# Altium footprint library 6-Connectors-1.PcbLib: 54 footprints (part 4 of 5) (continued)
## SCHURTER_GSF1.1201.31 [mm] "IEC Appliance Inlet C14 with Fuseholder 1 Pole" (continued)
  text "N" at 10.7,-10.65 h1.5
  text "L" at -16.822,-8.9 h1.5
3D body "SCHURTER_GSF1.1201.31.stp": height 24.45, standoff -4.55, extent -17.2,-18.9 17.2,12
3D body "v240-170.stp": height 0.02, standoff -1.65, extent 7.85,-11.1 10.25,-8.7
3D body "v240-170.stp": height 0.02, standoff -1.65, extent -1.2,-11.1 1.2,-8.7

## SCHURTER_GSF1.2202.31 [mm] "IEC Appliance Inlet C14 with 2 Pole Fuseholder"
height 24.45
pads (5):
  round 2.1 hole 1.4: 1(-12.7,-5.5) 3(12.7,-5.5)
  round 2.3 hole 1.6: 2(0,-9.9)
  round 1 hole 6 unplated mask+2.5: 4(-13.5,0) 5(13.5,0)
Top Overlay:
  drawing of 178 lines, arcs and shapes, not listed
  text "N" at 15.9,-8.95 h1.5
  text "L" at -16.797,-8.925 h1.5
Mechanical 8:
  circle w0.1: c12.7,-9.545 r2.5
  circle w0.1: c-12.7,-9.545 r2.5
  lines w0.1: -14.5,0 -13.5,0 ; -13.7,-5.5 -12.7,-5.5 ; -13.5,-1 -13.5,0 ; -13.5,1 -13.5,0 ; -13.407,-10.252 -12.7,-9.545 ; -13.407,-8.838 -12.7,-9.545 ; -12.7,-6.5 -12.7,-5.5 ; -12.7,-4.5 -12.7,-5.5 ; -12.5,0 -13.5,0 ; -11.993,-10.252 -12.7,-9.545 ; -11.993,-8.838 -12.7,-9.545 ; -11.7,-5.5 -12.7,-5.5 ; -8.875,-4.425 -12.7,-8.25 -12.7,-9.545 ; -1,-9.9 0,-9.9 ; -1,0 0,0 ; 0,-10.9 0,-9.9 ; 0,-8.9 0,-9.9 ; 0,-1 0,0 ; 0,1 0,0 ; 1,-9.9 0,-9.9 ; 1,0 0,0 ; 8.875,-4.425 12.7,-8.25 12.7,-9.545 ; 11.7,-5.5 12.7,-5.5 ; 11.993,-10.252 12.7,-9.545 ; 11.993,-8.838 12.7,-9.545 ; 12.5,0 13.5,0 ; 12.7,-6.5 12.7,-5.5 ; 12.7,-4.5 12.7,-5.5 ; 13.407,-10.252 12.7,-9.545 ; 13.407,-8.838 12.7,-9.545 ; 13.5,-1 13.5,0 ; 13.5,1 13.5,0 ; 13.7,-5.5 12.7,-5.5 ; 14.5,0 13.5,0
  text "3D Fuse (5X20) Stand-off Heigh" at -11.525,-3.975 h1
  text "Must be 2mm" at -5.075,-5.95 h1
Mechanical 14:
  drawing of 175 lines, arcs and shapes, not listed
  text "N" at 15.9,-8.95 h1.5
  text "L" at -16.797,-8.925 h1.5
3D body "SCHURTER_GSF1.2202.31.stp": height 24.45, standoff -4.55, extent -17.2,-13.3 17.2,12
3D body "v240-170.stp": height 0.02, standoff -1.65, extent -13.9,-6.7 -11.5,-4.3
3D body "v240-170.stp": height 0.02, standoff -1.65, extent -1.2,-11.1 1.2,-8.7
3D body "v240-170.stp": height 0.02, standoff -1.65, extent 11.5,-6.7 13.9,-4.3

## TP [mm]
height 11.7
pads (1):
  round 2 smd mask+1: W(0,0)
Top Overlay:
  circle w0.254: c0,0 r2.195
Keep-Out Layer:
  circle w0.025: c0,0 r2.017
3D body "1_016-1_016-3_tp.stp": height 0.02, standoff 0, extent -1.5,-1.5 1.5,1.5

## TYCO_1-338309-2 [mm] "Straight D-SUB 9 Male Contacts Connector with Harpoons and Female Screwlock (UNC4-40)"
height 11.7
pads (11):
  round 1.5 hole 0.8: 1(-5.486,1.423) 2(-2.743,1.423) 3(0,1.423) 4(2.743,1.423) 5(5.486,1.423) 6(-4.114,-1.423) 7(-1.371,-1.423) 8(1.372,-1.423) 9(4.115,-1.423)
  round 3.8 hole 3.2: 10(-12.495,0) 11(12.495,0)
Top Overlay:
  circle w0.5: c-5.48,7.42 r0.25
  lines w0.2: -15.445,-4.7 ccw(c-13.945,-4.7) -13.945,-6.2 13.945,-6.2 ccw(c13.945,-4.7) 15.445,-4.7 15.445,4.7 ccw(c13.945,4.7) 13.945,6.2 -13.945,6.2 ccw(c-13.945,4.7) -15.445,4.7 -15.445,-4.7 ; -8.775,1.021 cw(c-5.83,1.54) -5.83,4.53 5.83,4.53 cw(c5.83,1.54) 8.775,1.021 8.232,-2.059 cw(c5.287,-1.54) 5.287,-4.53 -5.287,-4.53 cw(c-5.287,-1.54) -8.231,-2.059 -8.775,1.021 ; -8.381,1.09 cw(c-5.83,1.54) -5.83,4.13 5.83,4.13 cw(c5.83,1.54) 8.381,1.09 7.838,-1.99 cw(c5.287,-1.54) 5.287,-4.13 -5.287,-4.13 cw(c-5.287,-1.54) -7.838,-1.99 -8.381,1.09
  text "6" at -6.21,-1.97 h1.2
  text "5" at 6.855,0.87 h1.2
  text "1" at -7.18,0.945 h1.2
  text "9" at 5.485,-2.02 h1.2
Mechanical 8:
  lines w0.1: -12.995,0 -12.495,0 ; -12.495,-0.5 -12.495,0 ; -12.495,0.5 -12.495,0 ; -11.995,0 -12.495,0 ; -5.986,1.423 -5.486,1.423 ; -5.486,0.923 -5.486,1.423 ; -5.486,1.923 -5.486,1.423 ; -4.986,1.423 -5.486,1.423 ; -4.614,-1.423 -4.114,-1.423 ; -4.114,-1.923 -4.114,-1.423 ; -4.114,-0.923 -4.114,-1.423 ; -3.614,-1.423 -4.114,-1.423 ; -3.243,1.423 -2.743,1.423 ; -2.743,0.923 -2.743,1.423 ; -2.743,1.923 -2.743,1.423 ; -2.243,1.423 -2.743,1.423 ; -1.871,-1.423 -1.371,-1.423 ; -1.371,-1.923 -1.371,-1.423 ; -1.371,-0.923 -1.371,-1.423 ; -0.871,-1.423 -1.371,-1.423 ; -0.5,0 0,0 ; -0.5,1.423 0,1.423 ; 0,-0.5 0,0 ; 0,0.5 0,0 ; 0,0.923 0,1.423 ; 0,1.923 0,1.423 ; 0.5,0 0,0 ; 0.5,1.423 0,1.423 ; 0.872,-1.423 1.372,-1.423 ; 1.372,-1.923 1.372,-1.423 ; 1.372,-0.923 1.372,-1.423 ; 1.872,-1.423 1.372,-1.423 ; 2.243,1.423 2.743,1.423 ; 2.743,0.923 2.743,1.423 ; 2.743,1.923 2.743,1.423 ; 3.243,1.423 2.743,1.423 ; 3.615,-1.423 4.115,-1.423 ; 4.115,-1.923 4.115,-1.423 ; 4.115,-0.923 4.115,-1.423 ; 4.615,-1.423 4.115,-1.423 ; 4.986,1.423 5.486,1.423 ; 5.486,0.923 5.486,1.423 ; 5.486,1.923 5.486,1.423 ; 5.986,1.423 5.486,1.423 ; 11.995,0 12.495,0 ; 12.495,-0.5 12.495,0 ; 12.495,0.5 12.495,0 ; 12.995,0 12.495,0
Mechanical 14:
  circle w0.1: c-4.114,-1.423 r0.51
  circle w0.1: c-1.371,-1.423 r0.51
  circle w0.1: c1.372,-1.423 r0.51
  circle w0.1: c4.115,-1.423 r0.51
  circle w0.1: c5.486,1.423 r0.51
  circle w0.1: c2.743,1.423 r0.51
  circle w0.1: c0,1.423 r0.51
  circle w0.1: c-2.743,1.423 r0.51
  circle w0.1: c-5.486,1.423 r0.51
  circle w0.1: c12.495,0 r1.422
  circle w0.1: c-12.495,0 r1.422
  lines w0.1: -15.445,-4.7 ccw(c-13.945,-4.7) -13.945,-6.2 13.945,-6.2 ccw(c13.945,-4.7) 15.445,-4.7 15.445,4.7 ccw(c13.945,4.7) 13.945,6.2 -13.945,6.2 ccw(c-13.945,4.7) -15.445,4.7 -15.445,-4.7 ; -8.775,1.021 cw(c-5.83,1.54) -5.83,4.53 5.83,4.53 cw(c5.83,1.54) 8.775,1.021 8.232,-2.059 cw(c5.287,-1.54) 5.287,-4.53 -5.287,-4.53 cw(c-5.287,-1.54) -8.231,-2.059 -8.775,1.021 ; -8.381,1.09 cw(c-5.83,1.54) -5.83,4.13 5.83,4.13 cw(c5.83,1.54) 8.381,1.09 7.838,-1.99 cw(c5.287,-1.54) 5.287,-4.13 -5.287,-4.13 cw(c-5.287,-1.54) -7.838,-1.99 -8.381,1.09
  text "9" at 5.485,-2.02 h1.2
  text "1" at -7.18,0.945 h1.2
  text "5" at 6.855,0.87 h1.2
  text "6" at -6.21,-1.97 h1.2
  text "9 D-Sub Male" at -6.053,4.872 h1.2
3D body "TYCO_1-338309-2.stp": height 11.95, standoff -3.2, extent -15.445,-6.2 15.445,6.2

## TYCO_1-1393480-7 [mm] "Right Angle D-SUB 9 Female Contacts for PCB, with Grounding Straps, Without Grounding Indents, and Without Mating Connector Lock"
height 10.06
pads (11):
  round 1.5 hole 0.9: 1(-5.48,-1.27) 2(-2.74,-1.27) 3(0,-1.27) 4(2.74,-1.27) 5(5.48,-1.27) 6(-4.11,1.27) 7(-1.37,1.27) 8(1.37,1.27) 9(4.11,1.27)
  round 5.5 hole 3.2: 10(-12.5,0) 11(12.5,0)
Top Overlay:
  lines w0.2: -15.595,-0.586 -15.595,-2.92 ccw(c-13.995,-2.92) -13.995,-4.52 -11.195,-4.52 ccw(c-11.195,-2.92) -9.595,-2.92 -9.595,-1.218 ; -15.595,0.586 -15.595,10.48 15.595,10.48 15.595,0.586 ; -15.595,8.03 -11.595,8.03 -11.595,8.53 ; -15.595,8.53 -9.75,8.53 ; -15.595,10.03 15.595,10.03 ; -14.095,8.53 -14.095,10.48 ; -10.195,8.53 -10.195,10.03 ; -9.75,9.33 9.75,9.33 ; -9.75,10.03 -9.75,4.33 9.75,4.33 9.75,10.03 ; -9.595,1.218 -9.595,4.33 ; -8.19,10.48 -8.19,16.48 cw(c-7.89,16.48) -7.89,16.78 7.89,16.78 cw(c7.89,16.48) 8.19,16.48 8.19,10.48 ; 9.595,-1.218 9.595,-2.92 ccw(c11.195,-2.92) 11.195,-4.52 13.995,-4.52 ccw(c13.995,-2.92) 15.595,-2.92 15.595,-0.586 ; 9.595,1.218 9.595,4.33 ; 9.75,8.53 15.595,8.53 ; 10.195,8.53 10.195,10.03 ; 11.595,8.53 11.595,8.03 15.595,8.03 ; 14.095,8.53 14.095,10.48
  text "9" at 6.731,0.508 h1.5
  text "1" at -7.239,-2.032 h1.5
  text "5" at 6.731,-2.032 h1.5
  text "6" at -7.366,0.508 h1.5
Mechanical 8:
  lines w0.1: -15.595,8.53 0,8.53 15.595,8.53 ; -13,0 -12.5,0 ; -12.5,-0.5 -12.5,0 ; -12.5,0.5 -12.5,0 ; -12,0 -12.5,0 ; -5.98,-1.27 -5.48,-1.27 ; -5.48,-1.77 -5.48,-1.27 ; -5.48,-0.77 -5.48,-1.27 ; -4.98,-1.27 -5.48,-1.27 ; -4.61,1.27 -4.11,1.27 ; -4.11,0.77 -4.11,1.27 ; -4.11,1.77 -4.11,1.27 ; -3.61,1.27 -4.11,1.27 ; -3.24,-1.27 -2.74,-1.27 ; -2.74,-1.77 -2.74,-1.27 ; -2.74,-0.77 -2.74,-1.27 ; -2.24,-1.27 -2.74,-1.27 ; -1.87,1.27 -1.37,1.27 ; -1.37,0.77 -1.37,1.27 ; -1.37,1.77 -1.37,1.27 ; -0.87,1.27 -1.37,1.27 ; -0.5,-1.27 0,-1.27 ; -0.5,0 0,0 ; 0,-1.77 0,-1.27 ; 0,-0.77 0,-1.27 ; 0,-0.5 0,0 ; 0,0.5 0,0 ; 0.5,-1.27 0,-1.27 ; 0.5,0 0,0 ; 0.87,1.27 1.37,1.27 ; 1.37,0.77 1.37,1.27 ; 1.37,1.77 1.37,1.27 ; 1.87,1.27 1.37,1.27 ; 2.24,-1.27 2.74,-1.27 ; 2.74,-1.77 2.74,-1.27 ; 2.74,-0.77 2.74,-1.27 ; 3.24,-1.27 2.74,-1.27 ; 3.61,1.27 4.11,1.27 ; 4.11,0.77 4.11,1.27 ; 4.11,1.77 4.11,1.27 ; 4.61,1.27 4.11,1.27 ; 4.98,-1.27 5.48,-1.27 ; 5.48,-1.77 5.48,-1.27 ; 5.48,-0.77 5.48,-1.27 ; 5.98,-1.27 5.48,-1.27 ; 12,0 12.5,0 ; 12.5,-0.5 12.5,0 ; 12.5,0.5 12.5,0 ; 13,0 12.5,0
Mechanical 14:
  circle w0.1: c-12.5,0 r1.55
  circle w0.1: c12.5,0 r1.55
  lines w0.1: -15.595,8.03 -11.595,8.03 -11.595,8.53 ; -15.595,8.53 -9.75,8.53 ; -15.595,10.03 15.595,10.03 ; -14.095,8.53 -14.095,10.48 ; -10.195,8.53 -10.195,10.03 ; -9.75,9.33 9.75,9.33 ; -9.75,10.03 -9.75,4.33 9.75,4.33 9.75,10.03 ; -9.595,4.33 -9.595,-2.92 cw(c-11.195,-2.92) -11.195,-4.52 -13.995,-4.52 cw(c-13.995,-2.92) -15.595,-2.92 -15.595,10.48 15.595,10.48 15.595,-2.92 cw(c13.995,-2.92) 13.995,-4.52 11.195,-4.52 cw(c11.195,-2.92) 9.595,-2.92 9.595,4.33 ; -8.19,10.48 -8.19,16.48 cw(c-7.89,16.48) -7.89,16.78 7.89,16.78 cw(c7.89,16.48) 8.19,16.48 8.19,10.48 ; -5.78,4.33 -5.78,-1.42 -5.18,-1.42 -5.18,4.33 ; -4.41,4.33 -4.41,1.12 -3.81,1.12 -3.81,4.33 ; -3.04,4.33 -3.04,-1.42 -2.44,-1.42 -2.44,4.33 ; -1.67,4.33 -1.67,1.12 -1.07,1.12 -1.07,4.33 ; -0.3,4.33 -0.3,-1.42 0.3,-1.42 0.3,4.33 ; 1.07,4.33 1.07,1.12 1.67,1.12 1.67,4.33 ; 2.44,4.33 2.44,-1.42 3.04,-1.42 3.04,4.33 ; 3.81,4.33 3.81,1.12 4.41,1.12 4.41,4.33 ; 5.18,4.33 5.18,-1.42 5.78,-1.42 5.78,4.33 ; 9.75,8.53 15.595,8.53 ; 10.195,8.53 10.195,10.03 ; 11.595,8.53 11.595,8.03 15.595,8.03 ; 14.095,8.53 14.095,10.48
3D body "TYCO_1-1393480-7.stp": height 10.06, standoff -3.2, extent -15.595,-4.52 15.595,16.78
3D body "v160-080.stp": height 0.02, standoff -1.65, extent -4.91,0.47 -3.31,2.07
3D body "v160-080.stp": height 0.02, standoff -1.65, extent -6.28,-2.07 -4.68,-0.47
3D body "v160-080.stp": height 0.02, standoff -1.65, extent -3.54,-2.07 -1.94,-0.47
3D body "v160-080.stp": height 0.02, standoff -1.65, extent -2.17,0.47 -0.57,2.07
3D body "v160-080.stp": height 0.02, standoff -1.65, extent -0.8,-2.07 0.8,-0.47
3D body "v160-080.stp": height 0.02, standoff -1.65, extent 1.94,-2.07 3.54,-0.47
3D body "v160-080.stp": height 0.02, standoff -1.65, extent 0.57,0.47 2.17,2.07
3D body "v160-080.stp": height 0.02, standoff -1.65, extent 3.31,0.47 4.91,2.07
3D body "v160-080.stp": height 0.02, standoff -1.65, extent 4.68,-2.07 6.28,-0.47

## TYCO_3-1634221-2 [mm] "Straight D-SUB 37 Male Contacts for PCB  with Harpoons and Female Screwlock (UNC4-40)"
height 12.6
pads (39):
  round 1.6 hole 1: 1(-24.93,1.42) 2(-22.16,1.42) 3(-19.39,1.42) 4(-16.62,1.42) 5(-13.85,1.42) 6(-11.08,1.42) 7(-8.31,1.42) 8(-5.54,1.42) 9(-2.77,1.42) 10(0,1.42) 11(2.77,1.42) 12(5.54,1.42) 13(8.31,1.42) 14(11.08,1.42) 15(13.85,1.42) 16(16.62,1.42) 17(19.39,1.42) 18(22.16,1.42) 19(24.93,1.42) 20(-23.545,-1.42) 21(-20.775,-1.42) 22(-18.005,-1.42) 23(-15.235,-1.42) 24(-12.465,-1.42) 25(-9.695,-1.42) 26(-6.925,-1.42) 27(-4.155,-1.42) 28(-1.385,-1.42) 29(1.385,-1.42) 30(4.155,-1.42) 31(6.925,-1.42) 32(9.695,-1.42) 33(12.465,-1.42) 34(15.235,-1.42) 35(18.005,-1.42) 36(20.775,-1.42) 37(23.545,-1.42)
  round 5.5 hole 3.1: 38(31.755,0) 39(-31.755,0)
Top Overlay:
  circle w0.5: c24.93,7.42 r0.25
  lines w0.2: -34.7,-4.675 ccw(c-33.1,-4.675) -33.1,-6.275 33.1,-6.275 ccw(c33.1,-4.675) 34.7,-4.675 34.7,4.675 ccw(c33.1,4.675) 33.1,6.275 -33.1,6.275 ccw(c-33.1,4.675) -34.7,4.675 -34.7,-4.675 ; -27.776,0.946 cw(c-24.92,1.45) -24.92,4.35 24.92,4.35 cw(c24.92,1.45) 27.776,0.946 27.265,-1.954 cw(c24.409,-1.45) 24.409,-4.35 -24.409,-4.35 cw(c-24.409,-1.45) -27.265,-1.954 -27.776,0.946 ; -27.382,1.016 cw(c-24.92,1.45) -24.92,3.95 24.92,3.95 cw(c24.92,1.45) 27.382,1.016 26.871,-1.884 cw(c24.409,-1.45) 24.409,-3.95 -24.409,-3.95 cw(c-24.409,-1.45) -26.871,-1.884 -27.382,1.016
  text "37" at 26.059,-5.715 h1.2
  text "20" at -28.27,-5.842 h1.2
  text "1" at -27,4.318 h1.2
  text "19" at 26.543,4.318 h1.2
Mechanical 8:
  drawing of 160 lines, arcs and shapes, not listed
Mechanical 14:
  circle w0.1: c-22.16,1.42 r0.5
  circle w0.1: c-19.39,1.42 r0.5
  circle w0.1: c-16.62,1.42 r0.5
  circle w0.1: c-15.235,-1.42 r0.5
  circle w0.1: c-11.08,1.42 r0.5
  circle w0.1: c-9.695,-1.42 r0.5
  circle w0.1: c-5.54,1.42 r0.5
  circle w0.1: c-2.77,1.42 r0.5
  circle w0.1: c0,1.42 r0.5
  circle w0.1: c1.385,-1.42 r0.5
  circle w0.1: c5.54,1.42 r0.5
  circle w0.1: c11.08,1.42 r0.5
  circle w0.1: c16.62,1.42 r0.5
  circle w0.1: c22.16,1.42 r0.5
  circle w0.1: c6.925,-1.42 r0.5
  circle w0.1: c12.465,-1.42 r0.5
  circle w0.1: c18.005,-1.42 r0.5
  circle w0.1: c23.545,-1.42 r0.5
  circle w0.1: c20.775,-1.42 r0.5
  circle w0.1: c15.235,-1.42 r0.5
  circle w0.1: c9.695,-1.42 r0.5
  circle w0.1: c4.155,-1.42 r0.5
  circle w0.1: c19.39,1.42 r0.5
  circle w0.1: c13.85,1.42 r0.5
  circle w0.1: c8.31,1.42 r0.5
  circle w0.1: c2.77,1.42 r0.5
  circle w0.1: c-1.385,-1.42 r0.5
  circle w0.1: c-4.155,-1.42 r0.5
  circle w0.1: c-6.925,-1.42 r0.5
  circle w0.1: c-8.31,1.42 r0.5
  circle w0.1: c-12.465,-1.42 r0.5
  circle w0.1: c-13.85,1.42 r0.5
  circle w0.1: c-18.005,-1.42 r0.5
  circle w0.1: c-20.775,-1.42 r0.5
  circle w0.1: c-23.545,-1.42 r0.5
  circle w0.1: c-24.93,1.42 r0.5
  circle w0.1: c24.93,1.42 r0.5
  circle w0.1: c-31.755,0 r1.422
  circle w0.1: c31.755,0 r1.422
  lines w0.1: -34.7,-4.675 ccw(c-33.1,-4.675) -33.1,-6.275 33.1,-6.275 ccw(c33.1,-4.675) 34.7,-4.675 34.7,4.675 ccw(c33.1,4.675) 33.1,6.275 -33.1,6.275 ccw(c-33.1,4.675) -34.7,4.675 -34.7,-4.675 ; -34.497,0 -33.126,2.375 -30.384,2.375 -29.013,0 -30.384,-2.375 -33.126,-2.375 -34.497,0 ; -27.776,0.946 cw(c-24.92,1.45) -24.92,4.35 24.92,4.35 cw(c24.92,1.45) 27.776,0.946 27.265,-1.954 cw(c24.409,-1.45) 24.409,-4.35 -24.409,-4.35 cw(c-24.409,-1.45) -27.265,-1.954 -27.776,0.946 ; -27.382,1.016 cw(c-24.92,1.45) -24.92,3.95 24.92,3.95 cw(c24.92,1.45) 27.382,1.016 26.871,-1.884 cw(c24.409,-1.45) 24.409,-3.95 -24.409,-3.95 cw(c-24.409,-1.45) -26.871,-1.884 -27.382,1.016 ; 29.013,0 30.384,2.375 33.126,2.375 34.497,0 33.126,-2.375 30.384,-2.375 29.013,0
  text "37 D-Sub Male" at -8.128,4.572 h1.5
  text "37" at 26.059,-5.715 h1.5
  text "20" at -28.27,-5.842 h1.5
  text "1" at -27,4.318 h1.5
  text "19" at 26.543,4.318 h1.5
3D body "TYCO_3-1634221-2.stp": height 12.6, standoff -4.5, extent -34.7,-6.275 34.7,6.275

## TYCO_3-1634225-2 [mm] "Straight D-SUB 37 Female Contacts for PCB  with Harpoons and Female Screwlock (UNC4-40)"
height 12.15
pads (39):
  round 1.6 hole 1: 1(24.93,1.42) 2(22.16,1.42) 3(19.39,1.42) 4(16.62,1.42) 5(13.85,1.42) 6(11.08,1.42) 7(8.31,1.42) 8(5.54,1.42) 9(2.77,1.42) 10(0,1.42) 11(-2.77,1.42) 12(-5.54,1.42) 13(-8.31,1.42) 14(-11.08,1.42) 15(-13.85,1.42) 16(-16.62,1.42) 17(-19.39,1.42) 18(-22.16,1.42) 19(-24.93,1.42) 20(23.545,-1.42) 21(20.775,-1.42) 22(18.005,-1.42) 23(15.235,-1.42) 24(12.465,-1.42) 25(9.695,-1.42) 26(6.925,-1.42) 27(4.155,-1.42) 28(1.385,-1.42) 29(-1.385,-1.42) 30(-4.155,-1.42) 31(-6.925,-1.42) 32(-9.695,-1.42) 33(-12.465,-1.42) 34(-15.235,-1.42) 35(-18.005,-1.42) 36(-20.775,-1.42) 37(-23.545,-1.42)
  round 5.5 hole 3.1: 38(31.755,0) 39(-31.755,0)
Top Overlay:
  circle w0.5: c24.93,7.42 r0.25
  lines w0.2: -34.7,-4.675 ccw(c-33.1,-4.675) -33.1,-6.275 33.1,-6.275 ccw(c33.1,-4.675) 34.7,-4.675 34.7,4.675 ccw(c33.1,4.675) 33.1,6.275 -33.1,6.275 ccw(c-33.1,4.675) -34.7,4.675 -34.7,-4.675 ; -27.382,1.016 cw(c-24.92,1.45) -24.92,3.95 24.92,3.95 cw(c24.92,1.45) 27.382,1.016 26.871,-1.884 cw(c24.409,-1.45) 24.409,-3.95 -24.409,-3.95 cw(c-24.409,-1.45) -26.871,-1.884 -27.382,1.016 ; -26.988,1.085 cw(c-24.92,1.45) -24.92,3.55 24.92,3.55 cw(c24.92,1.45) 26.988,1.085 26.477,-1.815 cw(c24.409,-1.45) 24.409,-3.55 -24.409,-3.55 cw(c-24.409,-1.45) -26.477,-1.815 -26.988,1.085
  text "20" at 22.249,-5.842 h1.2
  text "37" at -24.841,-5.842 h1.2
  text "19" at -25.984,4.445 h1.2
  text "1" at 24.765,4.445 h1.2
Mechanical 8:
  drawing of 160 lines, arcs and shapes, not listed
Mechanical 14:
  circle w0.1: c-22.16,1.42 r0.5
  circle w0.1: c-19.39,1.42 r0.5
  circle w0.1: c-16.62,1.42 r0.5
  circle w0.1: c-15.235,-1.42 r0.5
  circle w0.1: c-11.08,1.42 r0.5
  circle w0.1: c-9.695,-1.42 r0.5
  circle w0.1: c-5.54,1.42 r0.5
  circle w0.1: c-2.77,1.42 r0.5
  circle w0.1: c0,1.42 r0.5
  circle w0.1: c1.385,-1.42 r0.5
  circle w0.1: c5.54,1.42 r0.5
  circle w0.1: c11.08,1.42 r0.5
  circle w0.1: c16.62,1.42 r0.5
  circle w0.1: c22.16,1.42 r0.5
  circle w0.1: c6.925,-1.42 r0.5
  circle w0.1: c12.465,-1.42 r0.5
  circle w0.1: c18.005,-1.42 r0.5
  circle w0.1: c23.545,-1.42 r0.5
  circle w0.1: c20.775,-1.42 r0.5
  circle w0.1: c15.235,-1.42 r0.5
  circle w0.1: c9.695,-1.42 r0.5
  circle w0.1: c4.155,-1.42 r0.5
  circle w0.1: c19.39,1.42 r0.5
  circle w0.1: c13.85,1.42 r0.5
  circle w0.1: c8.31,1.42 r0.5
  circle w0.1: c2.77,1.42 r0.5
  circle w0.1: c-1.385,-1.42 r0.5
  circle w0.1: c-4.155,-1.42 r0.5
  circle w0.1: c-6.925,-1.42 r0.5
  circle w0.1: c-8.31,1.42 r0.5
  circle w0.1: c-12.465,-1.42 r0.5
  circle w0.1: c-13.85,1.42 r0.5
  circle w0.1: c-18.005,-1.42 r0.5
  circle w0.1: c-20.775,-1.42 r0.5
  circle w0.1: c-23.545,-1.42 r0.5
  circle w0.1: c-24.93,1.42 r0.5
  circle w0.1: c24.93,1.42 r0.5
  circle w0.1: c-31.755,0 r1.422
  circle w0.1: c31.755,0 r1.422
  lines w0.1: -34.7,-4.675 ccw(c-33.1,-4.675) -33.1,-6.275 33.1,-6.275 ccw(c33.1,-4.675) 34.7,-4.675 34.7,4.675 ccw(c33.1,4.675) 33.1,6.275 -33.1,6.275 ccw(c-33.1,4.675) -34.7,4.675 -34.7,-4.675 ; -34.497,0 -33.126,2.375 -30.384,2.375 -29.013,0 -30.384,-2.375 -33.126,-2.375 -34.497,0 ; -27.382,1.016 cw(c-24.92,1.45) -24.92,3.95 24.92,3.95 cw(c24.92,1.45) 27.382,1.016 26.871,-1.884 cw(c24.409,-1.45) 24.409,-3.95 -24.409,-3.95 cw(c-24.409,-1.45) -26.871,-1.884 -27.382,1.016 ; -26.988,1.085 cw(c-24.92,1.45) -24.92,3.55 24.92,3.55 cw(c24.92,1.45) 26.988,1.085 26.477,-1.815 cw(c24.409,-1.45) 24.409,-3.55 -24.409,-3.55 cw(c-24.409,-1.45) -26.477,-1.815 -26.988,1.085 ; 29.013,0 30.384,2.375 33.126,2.375 34.497,0 33.126,-2.375 30.384,-2.375 29.013,0
  text "37 D-Sub Female" at -9.525,4.318 h1.5
  text "20" at 22.249,-5.842 h1.5
  text "37" at -24.841,-5.842 h1.5
  text "19" at -25.984,4.445 h1.5
  text "1" at 24.765,4.445 h1.5
3D body "TYCO_3-1634225-2.stp": height 12.5, standoff -4.5, extent -34.7,-6.275 34.7,6.275

## TYCO_3-1634582-2 [mm] "Right Angle 25 Male Contacts D-SUB Connector With Boardlock and 4-40 UNC Screwlocks"
height 13.575
pads (27):
  round 1.7 hole 1: 1(16.62,-1.27) 2(13.85,-1.27) 3(11.08,-1.27) 4(8.31,-1.27) 5(5.54,-1.27) 6(2.77,-1.27) 7(0,-1.27) 8(-2.77,-1.27) 9(-5.54,-1.27) 10(-8.31,-1.27) 11(-11.08,-1.27) 12(-13.85,-1.27) 13(-16.62,-1.27) 14(15.235,1.27) 15(12.465,1.27) 16(9.695,1.27) 17(6.925,1.27) 18(4.155,1.27) 19(1.385,1.27) 20(-1.385,1.27) 21(-4.155,1.27) 22(-6.925,1.27) 23(-9.695,1.27) 24(-12.465,1.27) 25(-15.235,1.27)
  round 3.9 hole 3.2: 26(-23.52,0) 27(23.52,0)
Top Overlay:
  circle w0.5: c16.495,-4.305 r0.25
  lines w0.2: -26.567,2.62 -24.927,2.62 ; -26.567,7.21 -19.772,7.21 ; -26.567,7.85 26.533,7.85 ; -26.567,11.23 26.533,11.23 ; -26.525,9.2 26.533,9.2 ; -26.187,11.7 -26.187,17.2 -25.887,17.5 -21.187,17.5 -20.889,17.2 ; -26.184,17.2 cw(c-25.495,16.568) -25.572,17.5 cw(c-25.649,16.568) -24.959,17.2 -24.761,17.2 cw(c-23.537,14.767) -22.312,17.2 -22.114,17.2 cw(c-21.424,16.568) -21.501,17.5 cw(c-21.579,16.568) -20.889,17.2 ; -26.037,7.21 -26.037,6.96 -21.037,6.96 -21.037,7.21 ; -25.569,-1.15 -26.567,-1.15 -26.567,11.7 26.533,11.7 26.533,-1.15 25.569,-1.15 ; -24.877,6.96 -24.877,4.8 ; -24.862,11.7 -24.862,17.2 ; -22.212,11.7 -22.212,17.2 ; -22.197,6.96 -22.197,4.8 ; -22.147,2.62 -20.507,2.62 -20.507,7.21 ; -21.777,-1.576 -21.777,-3.08 21.743,-3.08 21.743,-1.538 ; -20.889,11.7 -20.889,17.2 ; -19.894,11.7 -19.894,17.2 cw(c-19.294,17.2) -19.294,17.8 19.263,17.8 cw(c19.263,17.2) 19.863,17.2 19.863,11.7 ; -19.772,-3.08 -19.772,7.85 ; 19.738,-3.08 19.738,7.85 ; 19.738,7.21 26.533,7.21 ; 20.473,7.21 20.473,2.62 22.113,2.62 ; 20.913,11.7 20.913,17.209 21.213,17.509 25.913,17.509 26.211,17.209 ; 20.916,17.209 cw(c21.605,16.577) 21.528,17.509 cw(c21.451,16.577) 22.141,17.209 22.339,17.209 cw(c23.563,14.777) 24.788,17.209 24.986,17.209 cw(c25.676,16.577) 25.599,17.509 cw(c25.522,16.577) 26.211,17.209 ; 21.003,7.21 21.003,6.96 26.003,6.96 26.003,7.21 ; 22.223,6.96 22.223,4.8 ; 22.238,11.7 22.238,17.209 ; 24.888,11.7 24.888,17.209 ; 24.893,2.62 26.533,2.62 ; 24.903,6.96 24.903,4.8 ; 26.211,11.7 26.211,17.209 ; -24.877,4.8 -22.197,4.8 ; -24.877,4.8 -24.577,4.5 -22.497,4.5 -22.197,4.8 ; 22.223,4.8 24.903,4.8 ; 22.223,4.8 22.523,4.5 24.603,4.5 24.903,4.8
  text "1" at 18.425,-1.77 h1.2
  text "25" at -18.86,0.72 h1.2
  text "14" at 17.04,0.77 h1.2
Mechanical 8:
  lines w0.1: -24.02,0 -23.52,0 ; -23.52,-0.5 -23.52,0 ; -23.52,0.5 -23.52,0 ; -23.02,0 -23.52,0 ; -17.12,-1.27 -16.62,-1.27 ; -16.62,-1.77 -16.62,-1.27 ; -16.62,-0.77 -16.62,-1.27 ; -16.12,-1.27 -16.62,-1.27 ; -15.735,1.27 -15.235,1.27 ; -15.235,0.77 -15.235,1.27 ; -15.235,1.77 -15.235,1.27 ; -14.735,1.27 -15.235,1.27 ; -14.35,-1.27 -13.85,-1.27 ; -13.85,-1.77 -13.85,-1.27 ; -13.85,-0.77 -13.85,-1.27 ; -13.35,-1.27 -13.85,-1.27 ; -12.965,1.27 -12.465,1.27 ; -12.465,0.77 -12.465,1.27 ; -12.465,1.77 -12.465,1.27 ; -11.965,1.27 -12.465,1.27 ; -11.58,-1.27 -11.08,-1.27 ; -11.08,-1.77 -11.08,-1.27 ; -11.08,-0.77 -11.08,-1.27 ; -10.58,-1.27 -11.08,-1.27 ; -10.195,1.27 -9.695,1.27 ; -9.695,0.77 -9.695,1.27 ; -9.695,1.77 -9.695,1.27 ; -9.195,1.27 -9.695,1.27 ; -8.81,-1.27 -8.31,-1.27 ; -8.31,-1.77 -8.31,-1.27 ; -8.31,-0.77 -8.31,-1.27 ; -7.81,-1.27 -8.31,-1.27 ; -7.425,1.27 -6.925,1.27 ; -6.925,0.77 -6.925,1.27 ; -6.925,1.77 -6.925,1.27 ; -6.425,1.27 -6.925,1.27 ; -6.04,-1.27 -5.54,-1.27 ; -5.54,-1.77 -5.54,-1.27 ; -5.54,-0.77 -5.54,-1.27 ; -5.04,-1.27 -5.54,-1.27 ; -4.655,1.27 -4.155,1.27 ; -4.155,0.77 -4.155,1.27 ; -4.155,1.77 -4.155,1.27 ; -3.655,1.27 -4.155,1.27 ; -3.27,-1.27 -2.77,-1.27 ; -2.77,-1.77 -2.77,-1.27 ; -2.77,-0.77 -2.77,-1.27 ; -2.27,-1.27 -2.77,-1.27 ; -1.885,1.27 -1.385,1.27 ; -1.385,0.77 -1.385,1.27 ; -1.385,1.77 -1.385,1.27 ; -0.885,1.27 -1.385,1.27 ; -0.5,-1.27 0,-1.27 ; -0.354,-0.354 0,0 ; -0.354,0.354 0,0 ; 0,-1.77 0,-1.27 ; 0,-0.77 0,-1.27 ; 0.354,-0.354 0,0 ; 0.354,0.354 0,0 ; 0.5,-1.27 0,-1.27 ; 0.885,1.27 1.385,1.27 ; 1.385,0.77 1.385,1.27 ; 1.385,1.77 1.385,1.27 ; 1.885,1.27 1.385,1.27 ; 2.27,-1.27 2.77,-1.27 ; 2.77,-1.77 2.77,-1.27 ; 2.77,-0.77 2.77,-1.27 ; 3.27,-1.27 2.77,-1.27 ; 3.655,1.27 4.155,1.27 ; 4.155,0.77 4.155,1.27 ; 4.155,1.77 4.155,1.27 ; 4.655,1.27 4.155,1.27 ; 5.04,-1.27 5.54,-1.27 ; 5.54,-1.77 5.54,-1.27 ; 5.54,-0.77 5.54,-1.27 ; 6.04,-1.27 5.54,-1.27 ; 6.425,1.27 6.925,1.27 ; 6.925,0.77 6.925,1.27 ; 6.925,1.77 6.925,1.27 ; 7.425,1.27 6.925,1.27 ; 7.81,-1.27 8.31,-1.27 ; 8.31,-1.77 8.31,-1.27 ; 8.31,-0.77 8.31,-1.27 ; 8.81,-1.27 8.31,-1.27 ; 9.195,1.27 9.695,1.27 ; 9.695,0.77 9.695,1.27 ; 9.695,1.77 9.695,1.27 ; 10.195,1.27 9.695,1.27 ; 10.58,-1.27 11.08,-1.27 ; 11.08,-1.77 11.08,-1.27 ; 11.08,-0.77 11.08,-1.27 ; 11.58,-1.27 11.08,-1.27 ; 11.965,1.27 12.465,1.27 ; 12.465,0.77 12.465,1.27 ; 12.465,1.77 12.465,1.27 ; 12.965,1.27 12.465,1.27 ; 13.35,-1.27 13.85,-1.27 ; 13.85,-1.77 13.85,-1.27 ; 13.85,-0.77 13.85,-1.27 ; 14.35,-1.27 13.85,-1.27 ; 14.735,1.27 15.235,1.27 ; 15.235,0.77 15.235,1.27 ; 15.235,1.77 15.235,1.27 ; 15.735,1.27 15.235,1.27 ; 16.12,-1.27 16.62,-1.27 ; 16.62,-1.77 16.62,-1.27 ; 16.62,-0.77 16.62,-1.27 ; 17.12,-1.27 16.62,-1.27 ; 23.02,0 23.52,0 ; 23.52,-0.5 23.52,0 ; 23.52,0.5 23.52,0 ; 24.02,0 23.52,0
Mechanical 14:
  lines w0.1: -26.567,2.62 -24.927,2.62 -24.927,-0.32 -23.987,-0.32 -23.987,2.17 cw(c-23.537,2.17) -23.087,2.17 -23.087,-0.32 -22.147,-0.32 -22.147,2.62 -20.507,2.62 -20.507,7.21 ; -26.567,7.21 -19.772,7.21 ; -26.567,7.85 26.533,7.85 ; -26.567,11.23 26.533,11.23 ; -26.525,9.2 26.533,9.2 ; -26.187,11.7 -26.187,17.2 -25.887,17.5 -21.187,17.5 -20.889,17.2 ; -26.184,17.2 cw(c-25.495,16.568) -25.572,17.5 cw(c-25.649,16.568) -24.959,17.2 -24.761,17.2 cw(c-23.537,14.767) -22.312,17.2 -22.114,17.2 cw(c-21.424,16.568) -21.501,17.5 cw(c-21.579,16.568) -20.889,17.2 ; -26.037,7.21 -26.037,6.96 -21.037,6.96 -21.037,7.21 ; -24.927,2.6 ccw(c-23.537,1.52) -25.297,1.52 -25.297,-1.15 -26.567,-1.15 -26.567,11.7 26.533,11.7 26.533,-1.15 25.263,-1.15 25.263,1.52 ccw(c23.503,1.52) 24.893,2.6 ; -24.877,6.96 -24.877,4.8 ; -24.862,11.7 -24.862,17.2 ; -22.212,11.7 -22.212,17.2 ; -22.197,6.96 -22.197,4.8 ; -22.147,2.6 cw(c-23.537,1.52) -21.777,1.52 -21.777,-3.08 21.743,-3.08 21.743,1.52 cw(c23.503,1.52) 22.113,2.6 ; -20.889,11.7 -20.889,17.2 ; -19.894,11.7 -19.894,17.2 cw(c-19.294,17.2) -19.294,17.8 19.263,17.8 cw(c19.263,17.2) 19.863,17.2 19.863,11.7 ; -19.772,-3.08 -19.772,7.85 ; 19.738,-3.08 19.738,7.85 ; 19.738,7.21 26.533,7.21 ; 20.473,7.21 20.473,2.62 22.113,2.62 22.113,-0.318 23.053,-0.32 23.053,2.17 cw(c23.503,2.17) 23.953,2.17 23.953,-0.32 24.893,-0.32 24.893,2.62 26.533,2.62 ; 20.913,11.7 20.913,17.209 21.213,17.509 25.913,17.509 26.211,17.209 ; 20.916,17.209 cw(c21.605,16.577) 21.528,17.509 cw(c21.451,16.577) 22.141,17.209 22.339,17.209 cw(c23.563,14.777) 24.788,17.209 24.986,17.209 cw(c25.676,16.577) 25.599,17.509 cw(c25.522,16.577) 26.211,17.209 ; 21.003,7.21 21.003,6.96 26.003,6.96 26.003,7.21 ; 22.223,6.96 22.223,4.8 ; 22.238,11.7 22.238,17.209 ; 24.888,11.7 24.888,17.209 ; 24.903,6.96 24.903,4.8 ; 26.211,11.7 26.211,17.209 ; -24.877,4.8 -22.197,4.8 ; -24.877,4.8 -24.577,4.5 -22.497,4.5 -22.197,4.8 ; 22.223,4.8 24.903,4.8 ; 22.223,4.8 22.523,4.5 24.603,4.5 24.903,4.8
  text "1" at 18.425,-1.77 h1.2
  text "25" at -18.86,0.72 h1.2
  text "14" at 17.04,0.77 h1.2
3D body "TYCO_3-1634582-2.stp": height 13.57, standoff -3.8, extent -26.567,-3.08 26.533,17.8